# Altium footprint library THU VIEN V1.PcbLib: 400 footprints (part 18 of 25)
Each footprint in its own frame and in the unit in brackets; x right, y up, seen from the top. Pads: shape width x height; smd on the part's side, far side on the other; paste and mask are expansions set on the pad; w line width, h text height; cw(c..) or ccw(c..) is an arc to the next point about the centre after c.
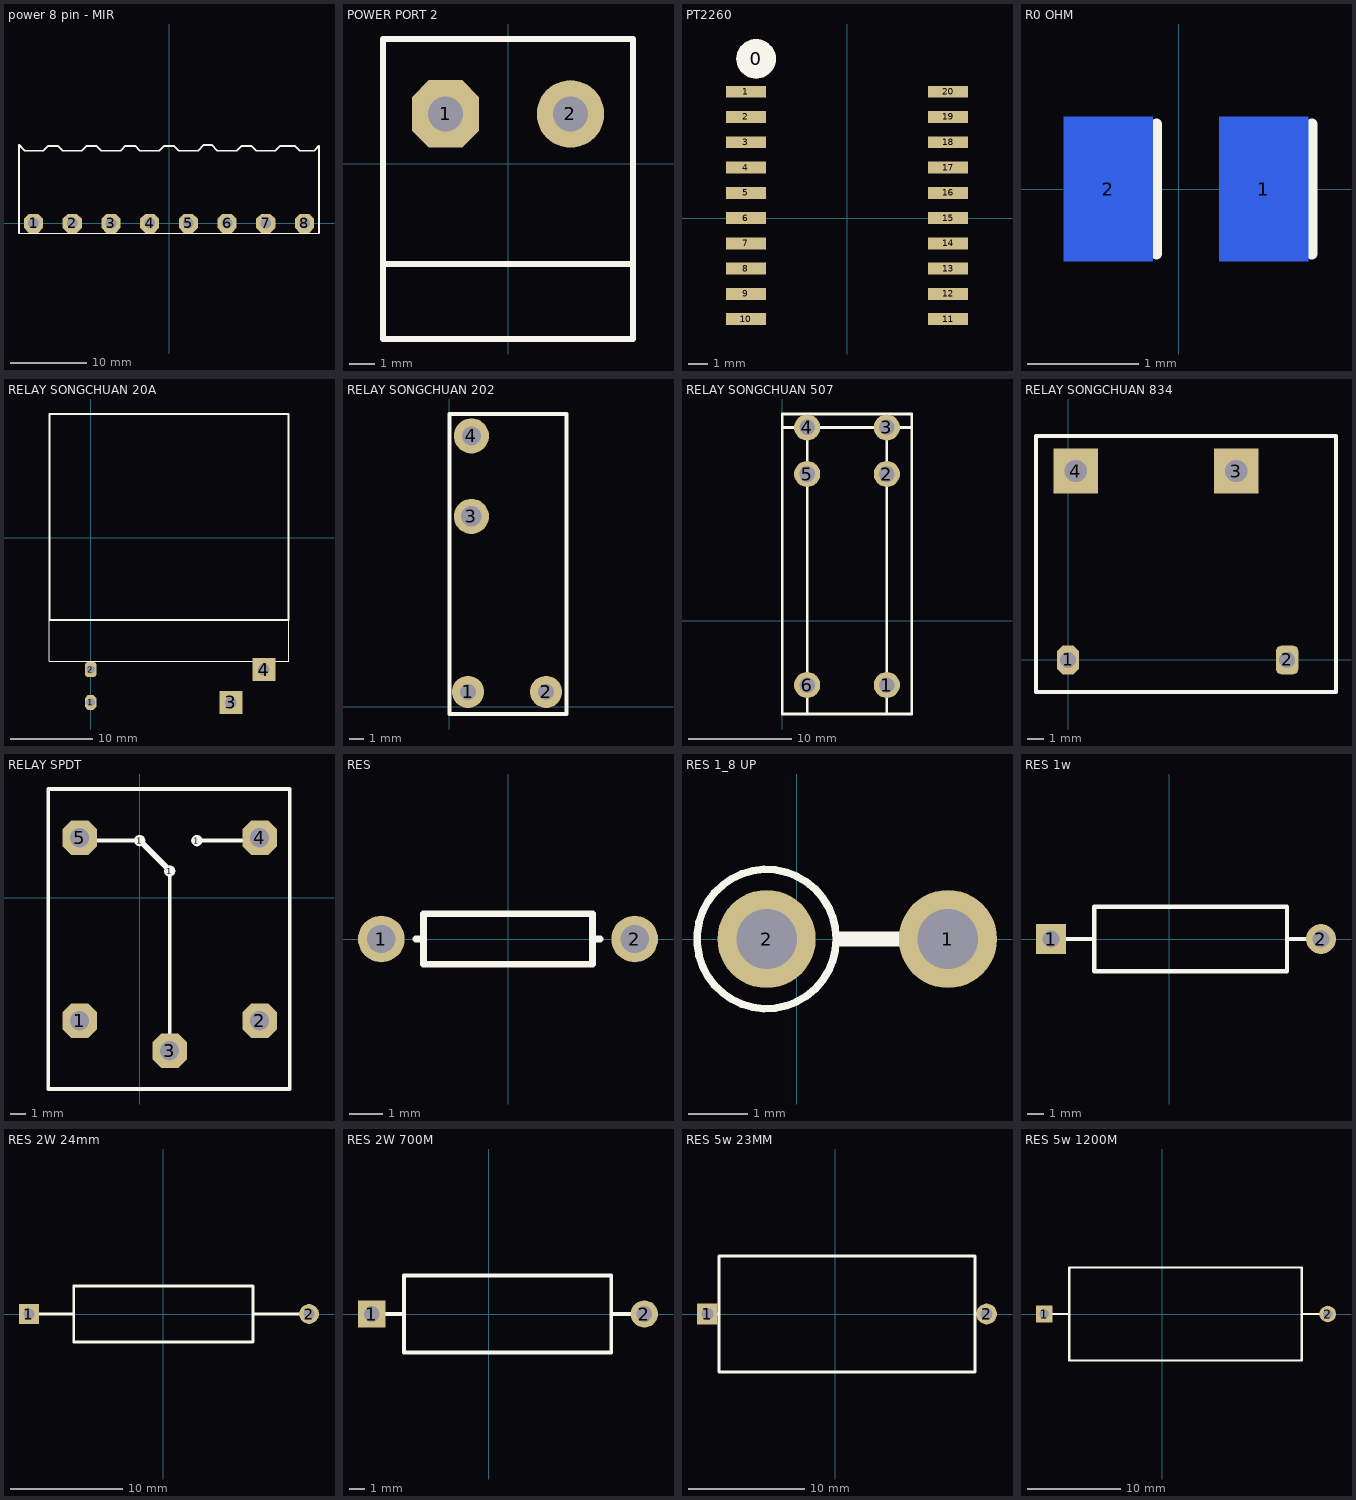
[diagram p17: the footprints below, top view; thin cyan lines are the x and y axes]

## power 8 pin - MIR [mm] "hkgvh"
pads (8):
  oct 2.5x2.5 hole 1.4: 1(-17.78,0) 2(-12.7,0) 3(-7.62,0) 4(-2.54,0) 5(2.54,0) 6(7.62,0) 7(12.7,0) 8(17.78,0)
Top Overlay:
  lines w0.15: -19.685,-1.27 19.685,-1.27
  lines w0.254: -19.685,-1.27 -19.685,10.287 -18.923,9.525 -16.51,9.525 -15.875,10.16 -14.605,10.16 -13.97,9.525 -11.43,9.525 -10.795,10.16 -9.525,10.16 -8.89,9.525 -6.35,9.525 -5.715,10.16 -4.445,10.16 -3.81,9.525 -1.27,9.525 -0.635,10.16 0.635,10.16 1.27,9.525 3.81,9.525 4.572,10.287 5.588,10.287 6.35,9.525 8.89,9.525 9.525,10.16 10.795,10.16 11.43,9.525 13.97,9.525 14.605,10.16 16.51,10.16 17.145,9.525 19.05,9.525 19.685,10.16 19.685,-1.27

## POWER PORT 2 [mm]
pads (2):
  oct 2.7x2.7 hole 1.397: 1(-2.5,2)
  round 2.7 hole 1.397: 2(2.5,2)
Top Overlay:
  lines w0.254: -5,-4 5,-4 ; -5,-7 5,-7 5,5 -5,5 -5,-7
3D body: height 9, standoff -3.8, extent -5.612,-7.367 5.588,5.233

## PT2260 [mm]
pads (21):
  round 2 on Top Overlay: 0(-4.572,8.001)
  rect 2x0.6 smd: 1(-5.08,6.35) 2(-5.08,5.08) 3(-5.08,3.81) 4(-5.08,2.54) 5(-5.08,1.27) 6(-5.08,0) 7(-5.08,-1.27) 8(-5.08,-2.54) 9(-5.08,-3.81) 10(-5.08,-5.08) 11(5.08,-5.08) 12(5.08,-3.81) 13(5.08,-2.54) 14(5.08,-1.27) 15(5.08,0) 16(5.08,1.27) 17(5.08,2.54) 18(5.08,3.81) 19(5.08,5.08) 20(5.08,6.35)
3D body: height 2.8, standoff 0, extent -5.168,-5.865 5.168,7.135

## R0 OHM [mm] "Dung de noi khi han"
pads (2):
  rect 0.8x1.3 smd far side: 1(0.762,0) 2(-0.635,0)
Top Overlay:
  lines w0.1: -0.203,-0.584 -0.203,0.584 ; 1.194,-0.584 1.194,0.584

## RELAY SONGCHUAN 20A [mm]
pads (4):
  oct 1.4x1.8 hole 1: 1(0,-20)
  rrect50% 1.4x1.8 hole 1: 2(0,-16)
  rect 2.794x2.794 hole 1.4: 3(17,-20) 4(21,-16)
Top Overlay:
  lines w0.127: -5,-10 -5,-15 24,-15 24,-10
  lines w0.254: -5,-10 24,-10 24,15 -5,15 -5,-10
3D body: height 12.64, standoff 0.04, extent -5.074,-15 23.926,14.8

## RELAY SONGCHUAN 202 [mm]
pads (4):
  round 2.2 hole 1.1: 1(1.27,1.016) 2(6.604,1.016)
  round 2.4 hole 1.4: 3(1.5,13)
  round 2.4 hole 1.3: 4(1.5,18.5)
Top Overlay:
  lines w0.254: 0,-0.5 0,20 8,20 8,-0.5 0,-0.5
3D body: height 5, standoff -3, extent 0.892,17.843 2.286,19.241
3D body: height 5, standoff -3, extent 0.806,12.302 2.2,13.699
3D body: height 5, standoff -3, extent 5.907,0.254 7.301,1.651
3D body: height 5, standoff -3, extent 0.576,0.318 1.97,1.715
3D body: height 15.7, standoff 0.2, extent 0,-0.508 8,20

## RELAY SONGCHUAN 507 [mm]
pads (6):
  round 2.524 hole 1.5: 1(10.1,-6.2) 2(10.1,14.2) 3(10.1,18.7) 4(2.4,18.7) 5(2.4,14.2) 6(2.4,-6.2)
Top Overlay:
  lines w0.254: 0,18.7 12.5,18.7 ; 2.4,-9 2.4,18.7 2.4,19.9 ; 10.1,-9 10.1,18.7 10.1,20 ; 0,-9 0,20 12.5,20 12.5,-9 0,-9
3D body: height 5, standoff -3, extent 1.706,18.002 3.1,19.399
3D body: height 5, standoff -3, extent 1.706,13.502 3.1,14.899
3D body: height 5, standoff -3, extent 9.406,18.002 10.8,19.399
3D body: height 5, standoff -3, extent 9.406,13.502 10.8,14.899
3D body: height 5, standoff -3, extent 9.406,-6.898 10.8,-5.501
3D body: height 5, standoff -3, extent 1.706,-6.898 3.1,-5.501
3D body: height 15.7, standoff 0.2, extent 0,-9 12.5,20

## RELAY SONGCHUAN 834 [mm]
pads (4):
  oct 1.4x1.8 hole 1: 1(0,0)
  rrect50% 1.4x1.8 hole 1: 2(13.7,0)
  rect 2.794x2.794 hole 1.4: 3(10.516,11.811) 4(0.483,11.811)
Top Overlay:
  lines w0.254: -2,-1 -2,1.54 ; -2,-2 -2,14 16.75,14 16.75,-2 -2,-2
3D body: height 5, standoff -3, extent 13.316,-0.387 14.113,0.412
3D body: height 5, standoff -3, extent -0.212,11.113 1.183,12.51
3D body: height 5, standoff -3, extent 9.821,11.113 11.216,12.51
3D body: height 11, standoff 0.2, extent -2,-2 16.75,14
3D body: height 5, standoff -3, extent -0.397,-0.399 0.4,0.399

## RELAY SPDT [mil]
pads (8):
  oct 90x90 hole 50: 1(-157.48,-322.83) 2(314.96,-322.83) 3(78.74,-401.57) 4(314.96,157.48) 5(-157.48,157.48)
  round 30 on Top Overlay: 1(0,150) 1(78.74,70) 1(150,150)
Top Overlay:
  lines w10: -150,150 0,150 ; 78.74,-401.57 78.74,73.43 ; 150,150 300,150 ; -240,-501.97 -240,285.43 393.7,285.43 393.7,-501.97 -240,-501.97
  lines w15: 0,150 79.37,70.63
3D body: height 58.74, standoff -610.55, extent -236.22,-511.81 393.7,275.59

## RES [mm] "Axial Device, Thru-Hole; 2 Leads; 0.3 in Pin Spacing"
height 1.524
pads (2):
  round 1.4 hole 0.85: 1(-3.81,0) 2(3.81,0)
Top Overlay:
  lines w0.2: -2.769,0 -2.54,0 ; 2.769,0 2.54,0 ; 2.54,0 2.54,0.762 -2.54,0.762 -2.54,-0.762 2.54,-0.762 2.54,0
3D body: height 2.09, standoff -1.91, extent -4.075,-1 4.025,1

## RES 1_8 UP [mil] "Axial Device, Thru-Hole; 2 Leads; 0.3 in Pin Spacing"
height 60
pads (2):
  round 65 hole 40: 1(100,0) 2(-20,0)
Top Overlay:
  circle w5: c-20,0 r46.1
  lines w10: 30,0 75,0 76,-1
3D body: height 368, standoff -45, extent -65.99,-46 110.01,46

## RES 1w [mil] "Axial Device, Thru-Hole; 2 Leads; 0.3 in Pin Spacing"
height 60
pads (2):
  rect 70x70 hole 40: 1(-275.59,0)
  round 70 hole 40: 2(354.33,0)
Top Overlay:
  lines w10: -275.59,0 -175,0 ; 275,0 354.33,0 ; -175,-75 275,-75 275,75 -175,75 -175,-75
3D body: height 218.58, standoff -47.17, extent -269.68,-88.58 348.43,88.59

## RES 2W 24mm [mil] "Axial Device, Thru-Hole; 2 Leads; 0.3 in Pin Spacing"
height 60
pads (2):
  rect 70x70 hole 40: 1(-472.44,0)
  round 70 hole 40: 2(511.81,0)
Top Overlay:
  lines w10: -472.44,0 -314.96,0 ; 314.96,0 511.81,0 ; -314.96,-98.43 -314.96,98.43 314.96,98.43 314.96,-98.43 -314.96,-98.43
3D body: height 348.43, standoff 33.46, extent -365.75,-98.42 365.75,98.43

## RES 2W 700M [mil] "Axial Device, Thru-Hole; 2 Leads; 0.3 in Pin Spacing"
height 60
pads (2):
  rect 70x70 hole 40: 1(-300,0)
  round 70 hole 40: 2(400,0)
Top Overlay:
  lines w10: -300,0 -216.54,0 ; 314.96,0 400,0 ; -216.54,-98.43 -216.54,98.43 314.96,98.43 314.96,-98.43 -216.54,-98.43
3D body: height 198.43, standoff -116.54, extent -317.75,-97 413.75,99.85

## RES 5w 23MM [mil] "Axial Device, Thru-Hole; 2 Leads; 0.3 in Pin Spacing"
height 60
pads (2):
  rect 70x70 hole 40: 1(-433.07,0)
  round 70 hole 40: 2(511.81,0)
Top Overlay:
  lines w10: -433.07,0 -393.7,0 ; 472.44,0 511.81,0 ; -393.7,-196.85 472.44,-196.85 472.44,196.85 -393.7,196.85 -393.7,-196.85

## RES 5w 1200M [mil] "Axial Device, Thru-Hole; 2 Leads; 0.3 in Pin Spacing"
height 60
pads (2):
  rect 70x70 hole 40: 1(-500,0)
  round 70 hole 40: 2(700,0)
Top Overlay:
  lines w10: -500,0 -393.7,0 ; 590.55,0 700,0 ; -393.7,-196.85 -393.7,196.85 590.55,196.85 590.55,-196.85 -393.7,-196.85
3D body: height 271.26, standoff -169.69, extent -510,-135.59 721.5,140